# Altium schematic symbol library 场效应管.SchLib: 1062 symbols (part 4 of 4)
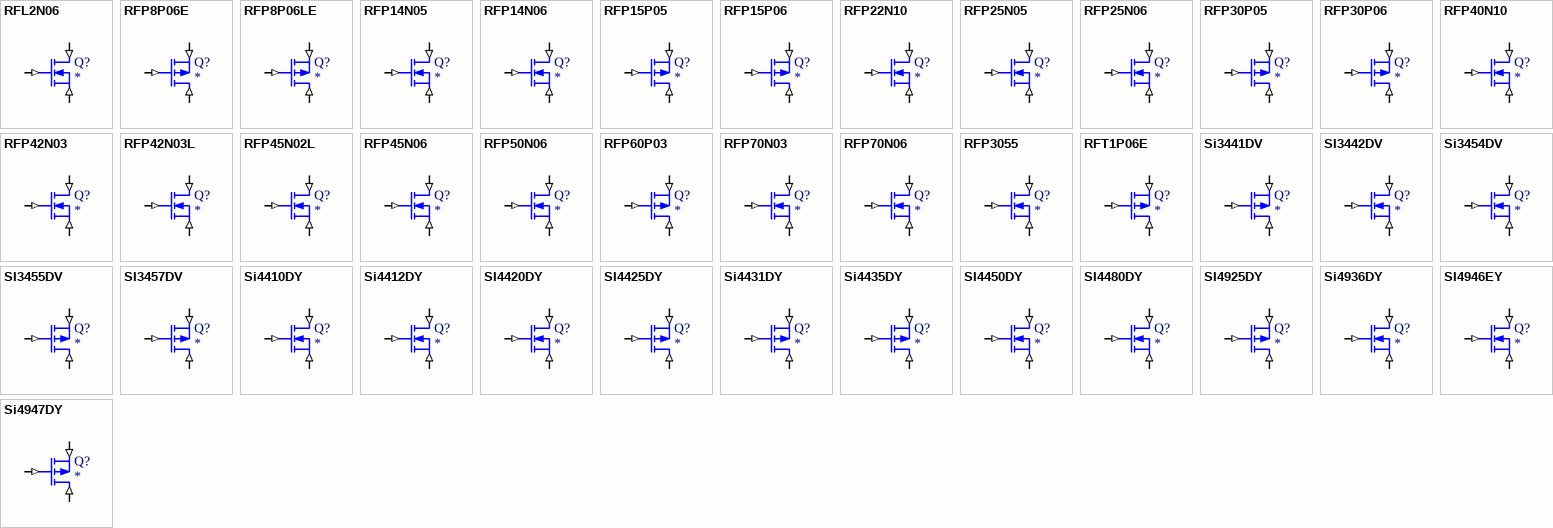
[diagram p29: symbols RFL2N06 to Si4947DY]

## RFP3055
designator Q?
N-Channel MOSFET
simulation model RFP3055 (SUBCKT)
pins: 1 D (in), 2 G (in), 3 S (in)
1 alternate drawing of the same symbol

## RFT1P06E
designator Q?
P-Channel MOSFET
simulation model RFT1P06E (SUBCKT)
pins: 1 D (in), 2 G (in), 3 S (in)
1 alternate drawing of the same symbol

## Si3441DV
designator Q?
P-Channel MOSFET
simulation model Si3441DV (SUBCKT)
pins: 1 D (in), 2 G (in), 3 S (in)
1 alternate drawing of the same symbol

## SI3442DV
designator Q?
N-Channel MOSFET
simulation model SI3442DV (SUBCKT)
pins: 1 D (in), 2 G (in), 3 S (in)
1 alternate drawing of the same symbol

## Si3454DV
designator Q?
N-Channel MOSFET
simulation model Si3454DV (SUBCKT)
pins: 1 D (in), 2 G (in), 3 S (in)
1 alternate drawing of the same symbol

## SI3455DV
designator Q?
P-Channel MOSFET
simulation model SI3455DV (SUBCKT)
pins: 1 D (in), 2 G (in), 3 S (in)
1 alternate drawing of the same symbol

## SI3457DV
designator Q?
P-Channel MOSFET
simulation model SI3457DV (SUBCKT)
pins: 1 D (in), 2 G (in), 3 S (in)
1 alternate drawing of the same symbol

## Si4410DY
designator Q?
N-Channel MOSFET
simulation model Si4410DY (SUBCKT)
pins: 1 D (in), 2 G (in), 3 S (in)
1 alternate drawing of the same symbol

## Si4412DY
designator Q?
N-Channel MOSFET
simulation model Si4412DY (SUBCKT)
pins: 1 D (in), 2 G (in), 3 S (in)
1 alternate drawing of the same symbol

## SI4420DY
designator Q?
N-Channel MOSFET
simulation model SI4420DY (SUBCKT)
pins: 1 D (in), 2 G (in), 3 S (in)
1 alternate drawing of the same symbol

## SI4425DY
designator Q?
P-Channel MOSFET
simulation model SI4425DY (SUBCKT)
pins: 1 D (in), 2 G (in), 3 S (in)
1 alternate drawing of the same symbol

## Si4431DY
designator Q?
P-Channel MOSFET
simulation model Si4431DY (SUBCKT)
pins: 1 D (in), 2 G (in), 3 S (in)
1 alternate drawing of the same symbol

## Si4435DY
designator Q?
P-Channel MOSFET
simulation model Si4435DY (SUBCKT)
pins: 1 D (in), 2 G (in), 3 S (in)
1 alternate drawing of the same symbol

## SI4450DY
designator Q?
N-Channel MOSFET
simulation model SI4450DY (SUBCKT)
pins: 1 D (in), 2 G (in), 3 S (in)
1 alternate drawing of the same symbol

## SI4480DY
designator Q?
N-Channel MOSFET
simulation model SI4480DY (SUBCKT)
pins: 1 D (in), 2 G (in), 3 S (in)
1 alternate drawing of the same symbol

## SI4925DY
designator Q?
P-Channel MOSFET
simulation model SI4925DY (SUBCKT)
pins: 1 D (in), 2 G (in), 3 S (in)
1 alternate drawing of the same symbol

## Si4936DY
designator Q?
N-Channel MOSFET
simulation model Si4936DY (SUBCKT)
pins: 1 D (in), 2 G (in), 3 S (in)
1 alternate drawing of the same symbol

## SI4946EY
designator Q?
N-Channel MOSFET
simulation model SI4946EY (SUBCKT)
pins: 1 D (in), 2 G (in), 3 S (in)
1 alternate drawing of the same symbol

## Si4947DY
designator Q?
P-Channel MOSFET
simulation model Si4947DY (SUBCKT)
pins: 1 D (in), 2 G (in), 3 S (in)
1 alternate drawing of the same symbol

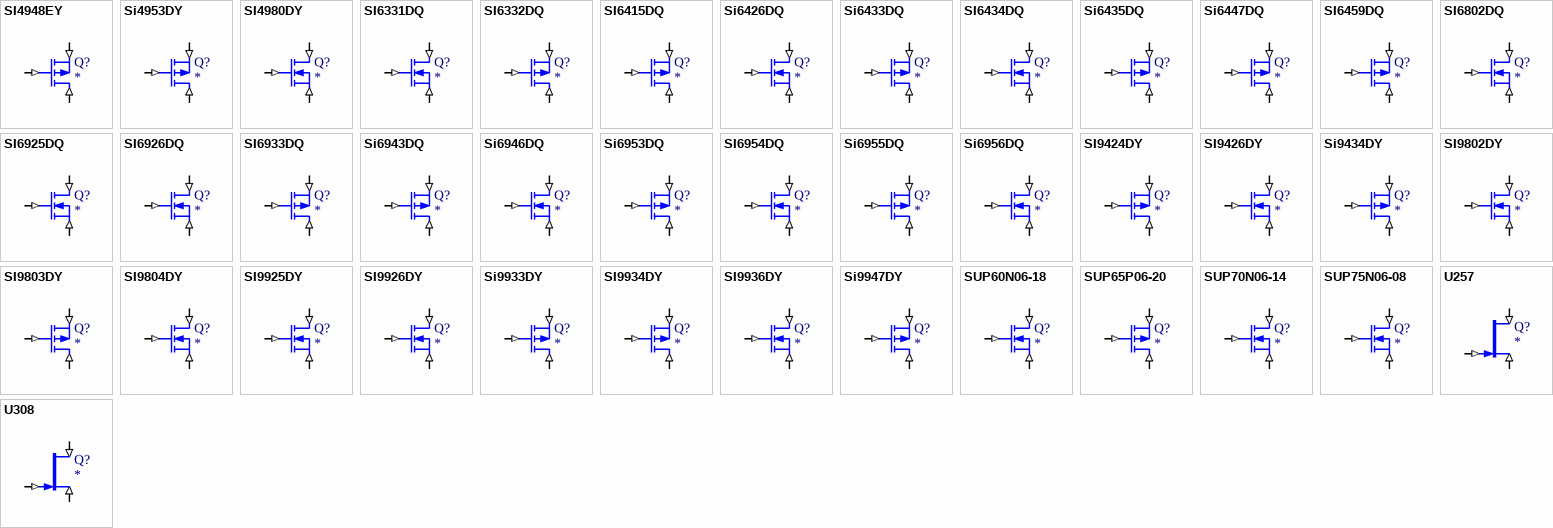
[diagram p25: symbols SI4948EY to U308]

## SI4948EY
designator Q?
P-Channel MOSFET
simulation model SI4948EY (SUBCKT)
pins: 1 D (in), 2 G (in), 3 S (in)
1 alternate drawing of the same symbol

## Si4953DY
designator Q?
P-Channel MOSFET
simulation model Si4953DY (SUBCKT)
pins: 1 D (in), 2 G (in), 3 S (in)
1 alternate drawing of the same symbol

## SI4980DY
designator Q?
N-Channel MOSFET
simulation model SI4980DY (SUBCKT)
pins: 1 D (in), 2 G (in), 3 S (in)
1 alternate drawing of the same symbol

## SI6331DQ
designator Q?
N-Channel MOSFET
simulation model SI6331DQ (SUBCKT)
pins: 1 D (in), 2 G (in), 3 S (in)
1 alternate drawing of the same symbol

## SI6332DQ
designator Q?
P-Channel MOSFET
simulation model SI6332DQ (SUBCKT)
pins: 1 D (in), 2 G (in), 3 S (in)
1 alternate drawing of the same symbol

## SI6415DQ
designator Q?
P-Channel MOSFET
simulation model SI6415DQ (SUBCKT)
pins: 1 D (in), 2 G (in), 3 S (in)
1 alternate drawing of the same symbol

## Si6426DQ
designator Q?
N-Channel MOSFET
simulation model Si6426DQ (SUBCKT)
pins: 1 D (in), 2 G (in), 3 S (in)
1 alternate drawing of the same symbol

## Si6433DQ
designator Q?
P-Channel MOSFET
simulation model Si6433DQ (SUBCKT)
pins: 1 D (in), 2 G (in), 3 S (in)
1 alternate drawing of the same symbol

## SI6434DQ
designator Q?
N-Channel MOSFET
simulation model SI6434DQ (SUBCKT)
pins: 1 D (in), 2 G (in), 3 S (in)
1 alternate drawing of the same symbol

## Si6435DQ
designator Q?
P-Channel MOSFET
simulation model Si6435DQ (SUBCKT)
pins: 1 D (in), 2 G (in), 3 S (in)
1 alternate drawing of the same symbol

## Si6447DQ
designator Q?
P-Channel MOSFET
simulation model Si6447DQ (SUBCKT)
pins: 1 D (in), 2 G (in), 3 S (in)
1 alternate drawing of the same symbol

## SI6459DQ
designator Q?
P-Channel MOSFET
simulation model SI6459DQ (SUBCKT)
pins: 1 D (in), 2 G (in), 3 S (in)
1 alternate drawing of the same symbol

## SI6802DQ
designator Q?
N-Channel MOSFET
simulation model SI6802DQ (SUBCKT)
pins: 1 D (in), 2 G (in), 3 S (in)
1 alternate drawing of the same symbol

## SI6925DQ
designator Q?
N-Channel MOSFET
simulation model SI6925DQ (SUBCKT)
pins: 1 D (in), 2 G (in), 3 S (in)
1 alternate drawing of the same symbol

## SI6926DQ
designator Q?
N-Channel MOSFET
simulation model SI6926DQ (SUBCKT)
pins: 1 D (in), 2 G (in), 3 S (in)
1 alternate drawing of the same symbol

## SI6933DQ
designator Q?
P-Channel MOSFET
simulation model SI6933DQ (SUBCKT)
pins: 1 D (in), 2 G (in), 3 S (in)
1 alternate drawing of the same symbol

## Si6943DQ
designator Q?
P-Channel MOSFET
simulation model Si6943DQ (SUBCKT)
pins: 1 D (in), 2 G (in), 3 S (in)
1 alternate drawing of the same symbol

## Si6946DQ
designator Q?
N-Channel MOSFET
simulation model Si6946DQ (SUBCKT)
pins: 1 D (in), 2 G (in), 3 S (in)
1 alternate drawing of the same symbol

## Si6953DQ
designator Q?
P-Channel MOSFET
simulation model Si6953DQ (SUBCKT)
pins: 1 D (in), 2 G (in), 3 S (in)
1 alternate drawing of the same symbol

## SI6954DQ
designator Q?
N-Channel MOSFET
simulation model SI6954DQ (SUBCKT)
pins: 1 D (in), 2 G (in), 3 S (in)
1 alternate drawing of the same symbol

## Si6955DQ
designator Q?
P-Channel MOSFET
simulation model Si6955DQ (SUBCKT)
pins: 1 D (in), 2 G (in), 3 S (in)
1 alternate drawing of the same symbol

## Si6956DQ
designator Q?
N-Channel MOSFET
simulation model Si6956DQ (SUBCKT)
pins: 1 D (in), 2 G (in), 3 S (in)
1 alternate drawing of the same symbol

## SI9424DY
designator Q?
P-Channel MOSFET
simulation model SI9424DY (SUBCKT)
pins: 1 D (in), 2 G (in), 3 S (in)
1 alternate drawing of the same symbol

## SI9426DY
designator Q?
N-Channel MOSFET
simulation model SI9426DY (SUBCKT)
pins: 1 D (in), 2 G (in), 3 S (in)
1 alternate drawing of the same symbol

## Si9434DY
designator Q?
P-Channel MOSFET
simulation model Si9434DY (SUBCKT)
pins: 1 D (in), 2 G (in), 3 S (in)
1 alternate drawing of the same symbol

## SI9802DY
designator Q?
N-Channel MOSFET
simulation model SI9802DY (SUBCKT)
pins: 1 D (in), 2 G (in), 3 S (in)
1 alternate drawing of the same symbol

## SI9803DY
designator Q?
P-Channel MOSFET
simulation model SI9803DY (SUBCKT)
pins: 1 D (in), 2 G (in), 3 S (in)
1 alternate drawing of the same symbol

## SI9804DY
designator Q?
N-Channel MOSFET
simulation model SI9804DY (SUBCKT)
pins: 1 D (in), 2 G (in), 3 S (in)
1 alternate drawing of the same symbol

## SI9925DY
designator Q?
N-Channel MOSFET
simulation model SI9925DY (SUBCKT)
pins: 1 D (in), 2 G (in), 3 S (in)
1 alternate drawing of the same symbol

## SI9926DY
designator Q?
N-Channel MOSFET
simulation model SI9926DY (SUBCKT)
pins: 1 D (in), 2 G (in), 3 S (in)
1 alternate drawing of the same symbol

## Si9933DY
designator Q?
P-Channel MOSFET
simulation model Si9933DY (SUBCKT)
pins: 1 D (in), 2 G (in), 3 S (in)
1 alternate drawing of the same symbol

## SI9934DY
designator Q?
P-Channel MOSFET
simulation model SI9934DY (SUBCKT)
pins: 1 D (in), 2 G (in), 3 S (in)
1 alternate drawing of the same symbol

## SI9936DY
designator Q?
N-Channel MOSFET
simulation model SI9936DY (SUBCKT)
pins: 1 D (in), 2 G (in), 3 S (in)
1 alternate drawing of the same symbol

## Si9947DY
designator Q?
P-Channel MOSFET
simulation model Si9947DY (SUBCKT)
pins: 1 D (in), 2 G (in), 3 S (in)
1 alternate drawing of the same symbol

## SUP60N06-18
designator Q?
N-Channel MOSFET
simulation model SUP60N06-18 (SUBCKT)
pins: 1 D (in), 2 G (in), 3 S (in)
1 alternate drawing of the same symbol

## SUP65P06-20
designator Q?
P-Channel MOSFET
simulation model SUP65P06-20 (SUBCKT)
pins: 1 D (in), 2 G (in), 3 S (in)
1 alternate drawing of the same symbol

## SUP70N06-14
designator Q?
N-Channel MOSFET
simulation model SUP70N06-14 (SUBCKT)
pins: 1 D (in), 2 G (in), 3 S (in)
1 alternate drawing of the same symbol

## SUP75N06-08
designator Q?
N-Channel MOSFET
simulation model SUP75N06-08 (SUBCKT)
pins: 1 D (in), 2 G (in), 3 S (in)
1 alternate drawing of the same symbol

## U257
designator Q?
N-Channel JFET
simulation model U257 (NJFET)
pins: 1 D (in), 2 G (in), 3 S (in)
1 alternate drawing of the same symbol

## U308
designator Q?
N-Channel JFET
simulation model U308 (NJFET)
pins: 1 D (in), 2 G (in), 3 S (in)
1 alternate drawing of the same symbol

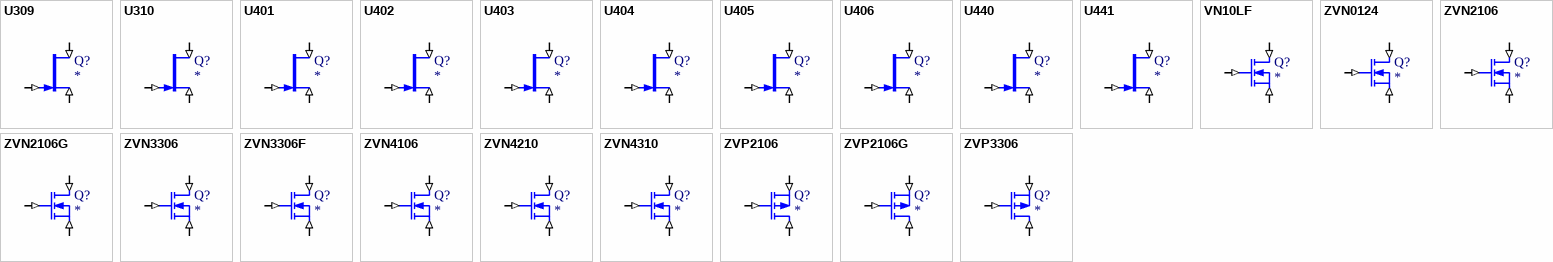
[diagram p26: symbols U309 to ZVP3306]

## U309
designator Q?
N-Channel JFET
simulation model U309 (NJFET)
pins: 1 D (in), 2 G (in), 3 S (in)
1 alternate drawing of the same symbol

## U310
designator Q?
N-Channel JFET
simulation model U310 (NJFET)
pins: 1 D (in), 2 G (in), 3 S (in)
1 alternate drawing of the same symbol

## U401
designator Q?
N-Channel JFET
simulation model U401 (NJFET)
pins: 1 D (in), 2 G (in), 3 S (in)
1 alternate drawing of the same symbol

## U402
designator Q?
N-Channel JFET
simulation model U402 (NJFET)
pins: 1 D (in), 2 G (in), 3 S (in)
1 alternate drawing of the same symbol

## U403
designator Q?
N-Channel JFET
simulation model U403 (NJFET)
pins: 1 D (in), 2 G (in), 3 S (in)
1 alternate drawing of the same symbol

## U404
designator Q?
N-Channel JFET
simulation model U404 (NJFET)
pins: 1 D (in), 2 G (in), 3 S (in)
1 alternate drawing of the same symbol

## U405
designator Q?
N-Channel JFET
simulation model U405 (NJFET)
pins: 1 D (in), 2 G (in), 3 S (in)
1 alternate drawing of the same symbol

## U406
designator Q?
N-Channel JFET
simulation model U406 (NJFET)
pins: 1 D (in), 2 G (in), 3 S (in)
1 alternate drawing of the same symbol

## U440
designator Q?
N-Channel JFET
simulation model U440 (NJFET)
pins: 1 D (in), 2 G (in), 3 S (in)
1 alternate drawing of the same symbol

## U441
designator Q?
N-Channel JFET
simulation model U441 (NJFET)
pins: 1 D (in), 2 G (in), 3 S (in)
1 alternate drawing of the same symbol

## VN10LF
designator Q?
N-Channel MOSFET
simulation model VN10LF (SUBCKT)
pins: 1 D (in), 2 G (in), 3 S (in)
1 alternate drawing of the same symbol

## ZVN0124
designator Q?
N-Channel MOSFET
simulation model ZVN0124 (SUBCKT)
pins: 1 D (in), 2 G (in), 3 S (in)
1 alternate drawing of the same symbol

## ZVN2106
designator Q?
N-Channel MOSFET
simulation model ZVN2106 (SUBCKT)
pins: 1 D (in), 2 G (in), 3 S (in)
1 alternate drawing of the same symbol

## ZVN2106G
designator Q?
N-Channel MOSFET
simulation model ZVN2106G (SUBCKT)
pins: 1 D (in), 2 G (in), 3 S (in)
1 alternate drawing of the same symbol

## ZVN3306
designator Q?
N-Channel MOSFET
simulation model ZVN3306 (SUBCKT)
pins: 1 D (in), 2 G (in), 3 S (in)
1 alternate drawing of the same symbol

## ZVN3306F
designator Q?
N-Channel MOSFET
simulation model ZVN3306F (SUBCKT)
pins: 1 D (in), 2 G (in), 3 S (in)
1 alternate drawing of the same symbol

## ZVN4106
designator Q?
N-Channel MOSFET
simulation model ZVN4106 (SUBCKT)
pins: 1 D (in), 2 G (in), 3 S (in)
1 alternate drawing of the same symbol

## ZVN4210
designator Q?
N-Channel MOSFET
simulation model ZVN4210 (SUBCKT)
pins: 1 D (in), 2 G (in), 3 S (in)
1 alternate drawing of the same symbol

## ZVN4310
designator Q?
N-Channel MOSFET
simulation model ZVN4310 (SUBCKT)
pins: 1 D (in), 2 G (in), 3 S (in)
1 alternate drawing of the same symbol

## ZVP2106
designator Q?
P-Channel MOSFET
simulation model ZVP2106 (SUBCKT)
pins: 1 D (in), 2 G (in), 3 S (in)
1 alternate drawing of the same symbol

## ZVP2106G
designator Q?
P-Channel MOSFET
simulation model ZVP2106G (SUBCKT)
pins: 1 D (in), 2 G (in), 3 S (in)
1 alternate drawing of the same symbol

## ZVP3306
designator Q?
P-Channel MOSFET
simulation model ZVP3306 (SUBCKT)
pins: 1 D (in), 2 G (in), 3 S (in)
1 alternate drawing of the same symbol